# Altium footprint library Lib.PcbLib: 52 footprints (part 1 of 4)
Each footprint in its own frame and in the unit in brackets; x right, y up, seen from the top. Pads: shape width x height; smd on the part's side, far side on the other; paste and mask are expansions set on the pad; w line width, h text height; cw(c..) or ccw(c..) is an arc to the next point about the centre after c.
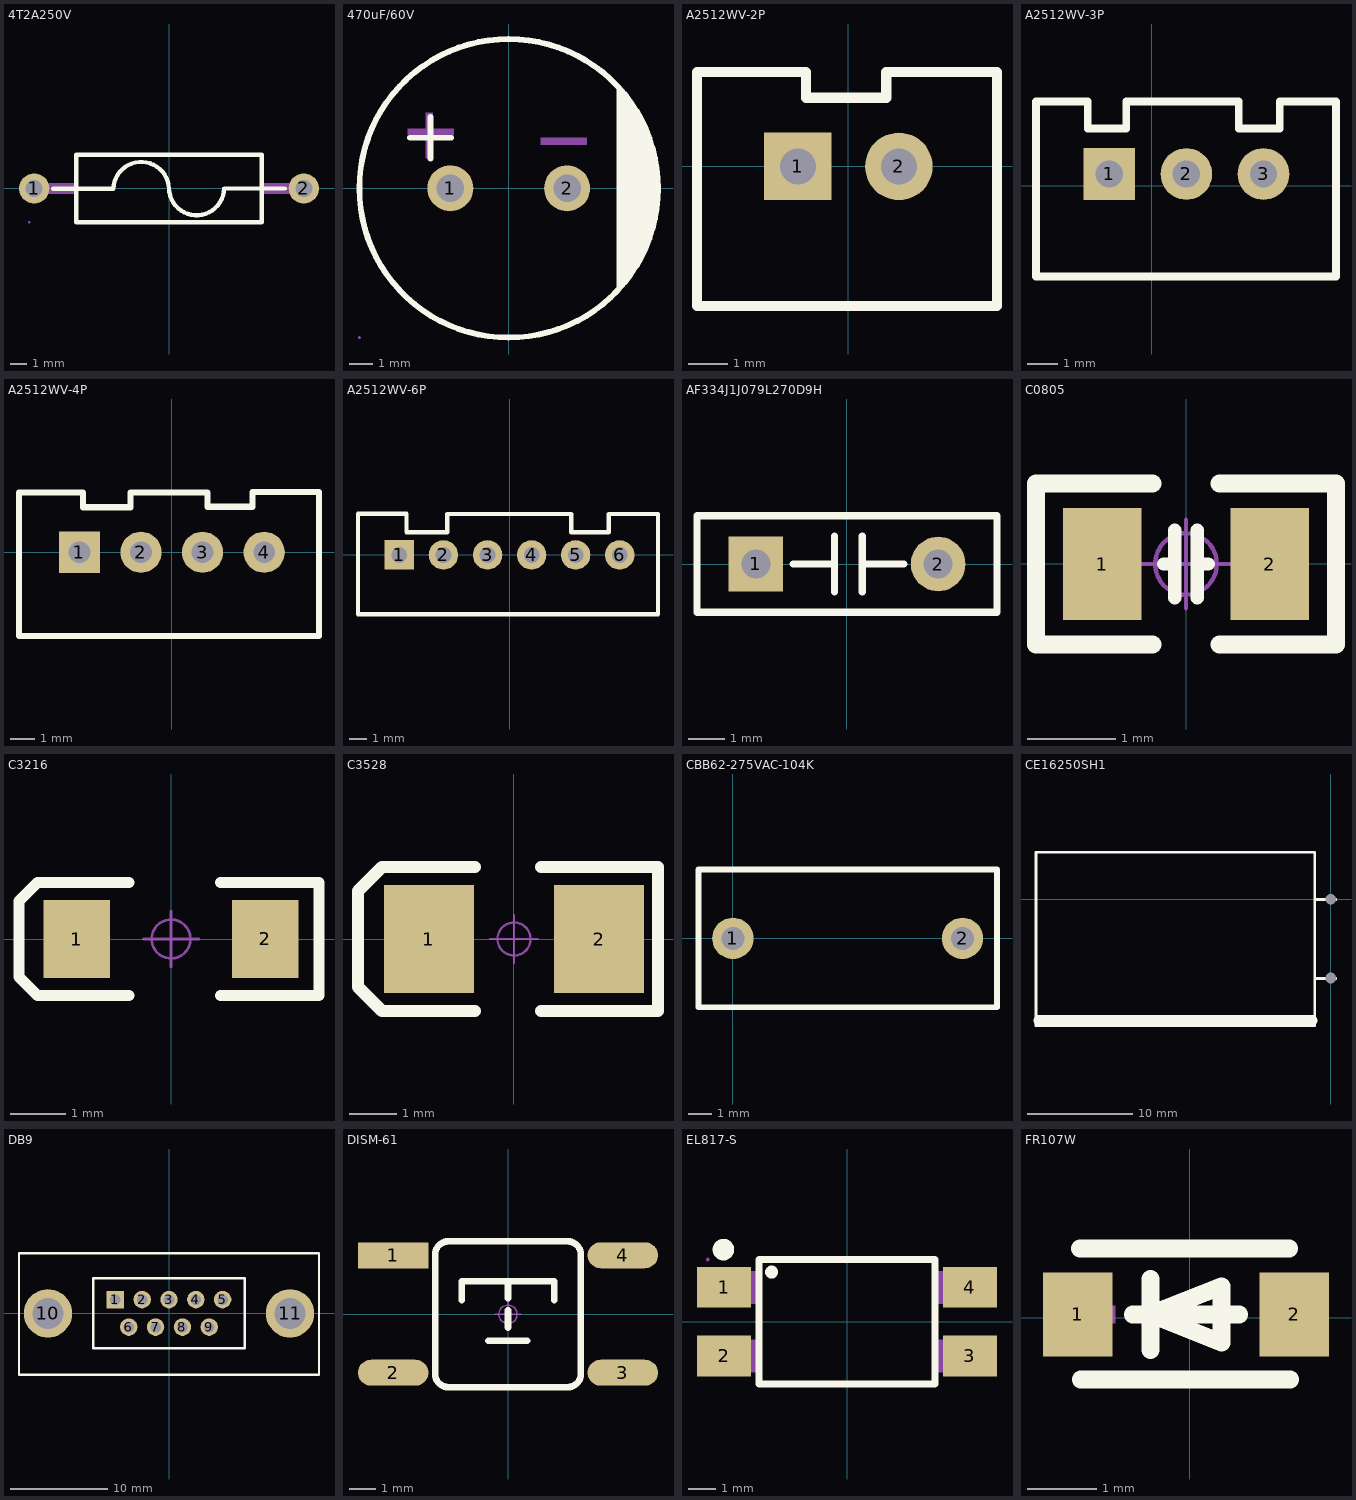
[diagram p0: the footprints below, top view; thin cyan lines are the x and y axes]

## 4T2A250V [mm]
pads (2):
  round 1.8 hole 1: 1(-8,0) 2(8,0)
Top Overlay:
  lines w0.254: -6.869,-0.02 -3.302,-0.02 cw(c-1.651,-0.073) 0,0 ccw(c1.635,0.047) 3.271,0 6.869,0 ; -5.5,-2 -5.5,2 5.5,2 5.5,-2 -5.5,-2
Mechanical 15:
  region: 8.3,0.3 8.3,-0.3 5.49,-0.3 5.49,0.3
  region: -8.3,0.3 -8.3,-0.3 -5.49,-0.3 -5.49,0.3
  region: 8.3,0 8.3,0.06 8.254,0.17 8.17,0.254 8.06,0.3 7.94,0.3 7.83,0.254 7.746,0.17 7.7,0.06 7.7,0 7.7,-0.06 7.746,-0.17 7.83,-0.254 7.94,-0.3 8.06,-0.3 8.17,-0.254 8.254,-0.17 8.3,-0.06
  region: -7.7,0 -7.7,0.06 -7.746,0.17 -7.83,0.254 -7.94,0.3 -8.06,0.3 -8.17,0.254 -8.254,0.17 -8.3,0.06 -8.3,0 -8.3,-0.06 -8.254,-0.17 -8.17,-0.254 -8.06,-0.3 -7.94,-0.3 -7.83,-0.254 -7.746,-0.17 -7.7,-0.06
  region: -8.24,-2 -8.24,-1.975 -8.275,-1.94 -8.325,-1.94 -8.36,-1.975 -8.36,-2 -8.36,-2.025 -8.325,-2.06 -8.275,-2.06 -8.24,-2.025
  lines w0.051: -5.5,-2 5.5,-2 5.5,2 -5.5,2 -5.5,-2

## 470uF/60V [mm]
pads (2):
  round 2 hole 1.2: 1(-2.54,0) 2(2.54,0)
Top Overlay:
  circle w0.254: c-0.001,0 r6.5
  region: 4.7,4.3 4.7,-4.5 5.8,-3 6.3,-1.7 6.4,-0.5 6.3,1.5 5.7,3.2
  lines w0.254: -4.301,2.2 -2.501,2.2 ; -3.401,1.3 -3.401,3.1
Mechanical 6:
  region: 1.4,2.2 3.3,2.2 3.4,2.2 3.4,2.1 3.4,1.9 1.4,1.9
  region: -3.6,1.3 -3.6,3.2 -3.6,3.3 -3.5,3.3 -3.3,3.3 -3.3,1.3
  region: -4.4,2.6 -2.5,2.6 -2.4,2.6 -2.4,2.5 -2.4,2.3 -4.4,2.3
  region: 4.72,4.286 4.72,-4.514 5.82,-3.014 6.32,-1.714 6.42,-0.514 6.32,1.486 5.72,3.186
Mechanical 15:
  region: 2.84,0 2.839,0.059 2.792,0.167 2.708,0.25 2.599,0.294 2.481,0.294 2.372,0.25 2.288,0.167 2.241,0.059 2.24,0 2.241,-0.059 2.288,-0.167 2.372,-0.25 2.481,-0.294 2.599,-0.294 2.708,-0.25 2.792,-0.167 2.839,-0.059
  region: -2.24,0 -2.241,0.059 -2.288,0.167 -2.372,0.25 -2.481,0.294 -2.599,0.294 -2.708,0.25 -2.792,0.167 -2.839,0.059 -2.84,0 -2.839,-0.059 -2.792,-0.167 -2.708,-0.25 -2.599,-0.294 -2.481,-0.294 -2.372,-0.25 -2.288,-0.167 -2.241,-0.059
  region: -6.44,-6.5 -6.44,-6.475 -6.475,-6.44 -6.525,-6.44 -6.56,-6.475 -6.56,-6.5 -6.56,-6.525 -6.525,-6.56 -6.475,-6.56 -6.44,-6.525
  lines w0.051: -6.5,0.5 -6.25,1.7 -6,2.6 -5.3,3.8 -4.7,4.55 -4,5.2 -2.6,6 -1.1,6.45 -0.45,6.5 0,6.5 0.55,6.5 1.15,6.4 1.95,6.2 2.55,6 3.4,5.6 4,5.15 4.65,4.6 5.15,4 5.5,3.4 5.9,2.7 6.25,1.7 6.4,1.1 6.45,0.55 6.5,-0.4 6.35,-1.4 5.95,-2.55 5.6,-3.2 4.75,-4.5 3.95,-5.2 3.05,-5.75 2.4,-6.05 1.55,-6.3 0.4,-6.5 -0.35,-6.5 -1.55,-6.35 -2.45,-6 -4.05,-5.15 -4.95,-4.15 -5.65,-3.3 -6.3,-1.7 -6.45,-0.7 -6.5,0.5
3D body "CAP 5X10X16.STEP": height 16.04, standoff -3.37, extent -5.013,-4.938 4.997,5.062

## A2512WV-2P [mm]
pads (2):
  rect 1.7x1.7 hole 0.9: 1(-1.27,0)
  round 1.7 hole 0.9: 2(1.27,0)
Top Overlay:
  lines w0.254: -3.807,-3.505 3.736,-3.505 3.736,2.37 2.954,2.37 0.953,2.37 0.953,1.727 -1.067,1.727 -1.067,2.37 -3.807,2.37 -3.807,-3.505
3D body "XH2.54-2P.STEP": height 7.05, standoff -2.45, extent -3.77,-3.3 3.77,2.4

## A2512WV-3P [mm]
pads (3):
  rect 1.7x1.7 hole 0.9: 1(-1.397,0.381)
  round 1.7 hole 0.9: 2(1.143,0.381) 3(3.683,0.381)
Top Overlay:
  lines w0.254: -3.81,-2.997 6.071,-2.997 6.071,2.769 4.216,2.769 4.216,1.881 2.87,1.881 2.87,2.769 -0.838,2.769 -0.838,1.881 -2.108,1.881 -2.108,2.769 -3.81,2.769 -3.81,-2.997
3D body "XH2.54-3P.STEP": height 7.03, standoff -2.47, extent -3.897,-2.919 6.183,2.781

## A2512WV-4P [mm]
pads (4):
  rect 1.7x1.7 hole 0.9: 1(-3.81,0)
  round 1.7 hole 0.9: 2(-1.27,0) 3(1.27,0) 4(3.81,0)
Top Overlay:
  lines w0.254: -6.299,-3.454 -6.299,2.464 -3.658,2.464 -3.658,1.854 -1.702,1.854 -1.702,2.464 1.473,2.464 1.473,1.88 3.327,1.88 3.327,2.489 6.071,2.489 6.071,-3.454 -6.299,-3.454
3D body "XH2.54-4P.STEP": height 7.03, standoff -2.47, extent -6.31,-3.3 6.31,2.4

## A2512WV-6P [mm]
pads (6):
  rect 1.7x1.7 hole 0.9: 1(-6.35,0)
  round 1.7 hole 0.9: 2(-3.81,0) 3(-1.27,0) 4(1.27,0) 5(3.81,0) 6(6.35,0)
Top Overlay:
  lines w0.254: -8.738,-3.429 8.56,-3.429 8.56,2.362 5.715,2.362 5.715,1.321 3.556,1.321 3.556,2.362 -3.581,2.362 -3.581,1.321 -5.944,1.321 -5.944,2.388 -8.738,2.388 -8.738,-3.429
3D body "XH2.54-6P.STEP": height 7.03, standoff -2.47, extent -8.85,-3.3 8.85,2.4

## AF334J1J079L270D9H [mm]
pads (2):
  rect 1.5x1.5 hole 0.8: 1(-2.5,0)
  round 1.5 hole 0.8: 2(2.5,0)
Top Overlay:
  lines w0.2: -1.484,0 -0.341,0 ; -0.341,-0.762 -0.341,0.762 ; 0.421,-0.762 0.421,0.762 ; 0.421,0 1.564,0 ; -4.115,-1.321 -4.115,1.321 -2.794,1.321 2.794,1.321 4.115,1.321 4.115,-1.321 2.794,-1.321 -2.794,-1.321 -4.115,-1.321
3D body "CL71.STEP": height 6.55, standoff -3.45, extent -3.6,-1.15 3.6,1.15

## C0805 [mil]
pads (2):
  rect 35x50 smd: 1(-37.4,0) 2(37.4,0)
Top Overlay:
  lines w6: -10,0 -5,0 ; -5,-15 -5,15 ; 5,-15 5,15 ; 5,0 10,0
  lines w8: -15,-36 -66.93,-36 -66.93,36 -15,36 ; 15,-36 66.93,-36 66.93,36 15,36
Mechanical 15:
  circle w1.97: c0,0 r13.78
  circle w1.97: c0,0 r13.78
  lines w1.97: -19.68,0 19.68,0 -19.68,0 ; 0,-19.69 0,19.68 0,-19.69
3D body "C 0805.STEP": height 20.08, standoff -0.39, extent -39.37,-24.02 39.37,24.02

## C3216 [mm]
pads (2):
  rect 1.2x1.4 smd: 1(-1.7,0) 2(1.7,0)
Top Overlay:
  lines w0.2: -0.762,-1.016 -2.413,-1.016 -2.743,-0.686 -2.743,0.686 -2.413,1.016 -0.762,1.016 ; 0.889,-1.016 2.667,-1.016 2.667,1.016 0.889,1.016
Mechanical 15:
  circle w0.05: c0,0 r0.35
  lines w0.05: -0.5,0 0.5,0 ; 0,-0.5 0,0.5
3D body "CD A(3216).STEP": height 1.6, standoff -0.01, extent -1.6,-0.8 1.6,0.8

## C3528 [mm]
pads (2):
  rect 1.905x2.286 smd: 1(-1.8,0) 2(1.8,0)
Top Overlay:
  lines w0.254: -0.826,-1.524 -2.794,-1.524 -3.302,-1.016 -3.302,1.016 -2.794,1.524 -0.825,1.524 ; 0.572,-1.524 3.048,-1.524 3.048,1.524 0.572,1.524
Mechanical 15:
  circle w0.05: c0,0 r0.35
  lines w0.05: -0.5,0 0.5,0 ; 0,-0.5 0,0.5
3D body "CD B(3528).STEP": height 1.9, standoff -0.01, extent -1.75,-1.4 1.75,1.4

## CBB62-275VAC-104K [mm]
pads (2):
  round 1.8 hole 1: 1(0,0) 2(10,0)
Top Overlay:
  lines w0.254: -1.5,-3 11.5,-3 11.5,3 -1.5,3 -1.5,-3
Mechanical 15:
  region: -1.44,-3 -1.44,-2.975 -1.475,-2.94 -1.525,-2.94 -1.56,-2.975 -1.56,-3 -1.56,-3.025 -1.525,-3.06 -1.475,-3.06 -1.44,-3.025 -1.44,-3
  region: 10.3,0 10.299,0.059 10.252,0.167 10.168,0.25 10.059,0.295 9.941,0.295 9.832,0.25 9.748,0.167 9.701,0.059 9.7,0 9.701,-0.059 9.748,-0.167 9.832,-0.25 9.941,-0.295 10.059,-0.295 10.168,-0.25 10.252,-0.167 10.299,-0.059 10.3,0
  region: 0.3,0 0.299,0.059 0.252,0.167 0.168,0.25 0.059,0.295 -0.059,0.295 -0.168,0.25 -0.252,0.167 -0.299,0.059 -0.3,0 -0.299,-0.059 -0.252,-0.167 -0.168,-0.25 -0.059,-0.295 0.059,-0.295 0.168,-0.25 0.252,-0.167 0.299,-0.059 0.3,0
  lines w0.051: -1.5,-3 -1.5,3 11.5,3 11.5,-3 -1.5,-3

## CE16250SH1 [mm]
pads (2):
  round 0 / inner round 2 / far side round 2 hole 1: 1(0,0) 2(0,-7.493)
Top Overlay:
  lines w0.254: -1.526,-7.534 0.474,-7.534 ; -1.526,-0.034 0.474,-0.034 ; -28.026,-12.034 -28.026,4.466 -1.526,4.466 -1.526,-12.034 -28.026,-12.034
  lines w1.016: -27.776,-11.534 -1.776,-11.534

## DB9 [mm]
pads (11):
  rect 1.8x1.8 hole 1.09 paste-2539.97 mask+0.051: 1(-5.54,1.42)
  round 1.8 hole 1.09 paste-2539.97 mask+0.051: 2(-2.77,1.42) 3(0,1.42) 4(2.771,1.42) 5(5.54,1.42) 6(-4.155,-1.42) 7(-1.385,-1.42) 8(1.385,-1.42) 9(4.155,-1.42)
  round 5 hole 3.2 paste-2539.97 mask+0.051: 10(-12.5,0) 11(12.5,0)
Top Overlay:
  lines w0.254: -15.494,-6.35 15.494,-6.35 15.494,6.223 -15.494,6.223 -15.494,-6.35 ; -7.81,-3.62 -7.81,3.619 -7.683,3.619 7.811,3.619 7.811,-3.62 -7.81,-3.62
Mechanical 15:
  circle w0.3: c-6.156,2.032 r0.15
3D body "3D_PCB1_2024-03-06.step": height 12.5, standoff -3.4, extent -15.519,-6.873 15.582,7.188

## DISM-61 [mm]
pads (4):
  rect 2.7x1 smd: 1(-4.4,2.261)
  oval 2.7x1 smd: 2(-4.4,-2.239) 3(4.4,-2.239) 4(4.4,2.261)
Top Overlay:
  lines w0.254: -1.778,0.533 -1.778,1.27 1.778,1.27 1.778,0.533 ; -0.762,-1.016 0.737,-1.016 ; 0,-0.508 0,0.152 ; 0,0.61 0,1.27 ; -2.794,-2.286 ccw(c-2.286,-2.286) -2.286,-2.794 2.286,-2.794 ccw(c2.286,-2.286) 2.794,-2.286 2.794,2.286 ccw(c2.286,2.286) 2.286,2.794 -2.286,2.794 ccw(c-2.286,2.286) -2.794,2.286 -2.794,-2.286
Mechanical 15:
  circle w0.05: c0,0 r0.35
  lines w0.05: -0.5,0 0.5,0 ; 0,-0.5 0,0.5
3D body "TSW SMD-6x6x4.3.STEP": height 4.25, standoff 0.05, extent -4.5,-3 4.5,3

## EL817-S [mm]
pads (4):
  rect 2x1.5 smd: 1(-4.55,1.27) 2(-4.55,-1.27) 3(4.55,-1.27) 4(4.55,1.27)
Top Overlay:
  circle w0.4: c-4.572,2.667 r0.2
  circle w0.254: c-2.789,1.834 r0.114
  lines w0.254: -3.25,-2.3 -3.25,2.3 3.25,2.3 3.25,-2.3 -3.25,-2.3
Mechanical 6:
  circle w0.5: c-3.937,1.27 r0.25
Mechanical 15:
  region: -5.15,0.87 -5.15,1.67 -4.55,1.67 -4.55,0.87
  region: -4.6,0.67 -4.6,1.87 -3.24,1.87 -3.24,0.67
  region: 4.55,0.87 4.55,1.67 5.15,1.67 5.15,0.87
  region: 3.24,0.67 3.24,1.87 4.6,1.87 4.6,0.67
  region: -4.6,-1.87 -4.6,-0.67 -3.24,-0.67 -3.24,-1.87
  region: -5.15,-1.67 -5.15,-0.87 -4.55,-0.87 -4.55,-1.67
  region: 3.24,-1.87 3.24,-0.67 4.6,-0.67 4.6,-1.87
  region: 4.55,-1.67 4.55,-0.87 5.15,-0.87 5.15,-1.67
  region: -5.09,2.3 -5.091,2.324 -5.126,2.359 -5.174,2.359 -5.209,2.324 -5.21,2.3 -5.209,2.275 -5.174,2.241 -5.125,2.241 -5.09,2.275
  lines w0.051: -3.25,-2.3 -3.25,2.3 3.25,2.3 3.25,-2.3 -3.25,-2.3

## FR107W [mm]
pads (2):
  rect 1x1.2 smd paste+0 mask+0.051: 1(-1.605,0.044) 2(1.495,0.044)
Top Overlay:
  lines w0.254: -1.575,0.991 1.425,0.991 ; -1.562,-0.889 1.438,-0.889 ; -0.817,0.044 0.707,0.044 ; -0.563,-0.464 -0.563,0.552 ; -0.563,0.044 0.453,-0.362 0.453,0.451 -0.563,0.044
Mechanical 15:
  region: -1.96,0.171 -1.071,0.171 -1.071,-0.083 -1.96,-0.083
  region: 1.416,-0.392 1.416,0.497 1.67,0.497 1.67,-0.392
  region: 1.088,0.171 1.977,0.171 1.977,-0.083 1.088,-0.083
3D body "SOD-123.STEP": height 1.22, standoff 0, extent -1.952,-0.736 1.748,0.864